# Altium footprint library PcbLib_ICs.PcbLib: 317 footprints (part 10 of 24) (continued)
## LQFN28 [mm] "QFN-28 package 4x5 mm from Linear Technology devices" (continued)
  lines w0.05: -2.6,-3.1 -2.6,3.1 2.6,3.1 2.6,-3.1 -2.6,-3.1
  lines w0.1: -0.5,0 0.5,0 ; 0,-0.5 0,0.5
3D body "QFN-28(LINEAR).step": height 0.75, standoff 0, extent -2.1,-2.6 2.1,2.6

## LQFP-32 [mm] "TQFP, 32-Leads, Body 7.00x7.00mm, Pitch 0.80mm, IPC Medium Density"
height 1.6
pads (32):
  rect 1.4x0.55 smd paste+0 mask+0.05: 1(-4.2,2.8)
  oval 1.4x0.55 smd paste+0 mask+0.05: 2(-4.2,2) 3(-4.2,1.2) 4(-4.2,0.4) 5(-4.2,-0.4) 6(-4.2,-1.2) 7(-4.2,-2) 8(-4.2,-2.8) 17(4.2,-2.8) 18(4.2,-2) 19(4.2,-1.2) 20(4.2,-0.4) 21(4.2,0.4) 22(4.2,1.2) 23(4.2,2) 24(4.2,2.8)
  oval 0.55x1.4 smd paste+0 mask+0.05: 9(-2.8,-4.2) 10(-2,-4.2) 11(-1.2,-4.2) 12(-0.4,-4.2) 13(0.4,-4.2) 14(1.2,-4.2) 15(2,-4.2) 16(2.8,-4.2) 25(2.8,4.2) 26(2,4.2) 27(1.2,4.2) 28(0.4,4.2) 29(-0.4,4.2) 30(-1.2,4.2) 31(-2,4.2) 32(-2.8,4.2)
Top Overlay:
  circle w0.25: c-2.5,2.5 r0.125
  circle w0.25: c-4.75,3.625 r0.125
  rectangle: -3.75,3.2 -3.2,3.75
  lines w0.2: -3.65,-3.3 -3.65,-3.65 -3.3,-3.65 ; 3.3,-3.65 3.65,-3.65 3.65,-3.3 ; 3.3,3.65 3.65,3.65 3.65,3.3
Top Assy:
  drawing of 571 lines, arcs and shapes, not listed
  text ".Designator" at -3.443,-0.467 h2
Top Text:
  lines w0.05: -5.15,-5.15 -5.15,5.15 5.15,5.15 5.15,-5.15 -5.15,-5.15
  lines w0.1: -0.5,0 0.5,0 ; 0,-0.5 0,0.5
3D body "lqfp32.STEP": height 1.5, standoff 0.02, extent -4.5,-4.5 4.5,4.5

## LQFP-48 [mm] "TSQFP, 48-Leads, Body 7,00x7,00mm, Pitch 0,50mm, IPC Medium Density"
height 1.6
pads (48):
  rect 1.45x0.3 smd paste+0 mask+0.05: 1(-4.225,2.75)
  oval 1.45x0.3 smd paste+0 mask+0.05: 2(-4.225,2.25) 3(-4.225,1.75) 4(-4.225,1.25) 5(-4.225,0.75) 6(-4.225,0.25) 7(-4.225,-0.25) 8(-4.225,-0.75) 9(-4.225,-1.25) 10(-4.225,-1.75) 11(-4.225,-2.25) 12(-4.225,-2.75) 25(4.225,-2.75) 26(4.225,-2.25) 27(4.225,-1.75) 28(4.225,-1.25) 29(4.225,-0.75) 30(4.225,-0.25) 31(4.225,0.25) 32(4.225,0.75) 33(4.225,1.25) 34(4.225,1.75) 35(4.225,2.25) 36(4.225,2.75)
  oval 0.3x1.45 smd paste+0 mask+0.05: 13(-2.75,-4.225) 14(-2.25,-4.225) 15(-1.75,-4.225) 16(-1.25,-4.225) 17(-0.75,-4.225) 18(-0.25,-4.225) 19(0.25,-4.225) 20(0.75,-4.225) 21(1.25,-4.225) 22(1.75,-4.225) 23(2.25,-4.225) 24(2.75,-4.225) 37(2.75,4.225) 38(2.25,4.225) 39(1.75,4.225) 40(1.25,4.225) 41(0.75,4.225) 42(0.25,4.225) 43(-0.25,4.225) 44(-0.75,4.225) 45(-1.25,4.225) 46(-1.75,4.225) 47(-2.25,4.225) 48(-2.75,4.225)
Top Overlay:
  circle w0.25: c-4.25,3.5 r0.125
  rectangle: -3.85,3.15 -3.15,3.85
  lines w0.2: -3.75,-3.225 -3.75,-3.75 -3.225,-3.75 ; 3.225,-3.75 3.75,-3.75 3.75,-3.225 ; 3.225,3.75 3.75,3.75 3.75,3.225
Top Assy:
  drawing of 713 lines, arcs and shapes, not listed
  text ".Designator" at -3.443,-0.467 h2
Top Text:
  lines w0.05: -5.2,-5.2 5.2,-5.2 5.2,5.2 -5.2,5.2 -5.2,-5.2
  lines w0.1: -0.5,0 0.5,0 ; 0,-0.5 0,0.5
3D body "User Library-LQFP48_Grid_0_5.STEP": height 1.6, standoff 0, extent -4.5,-4.499 4.5,4.501

## LQFP-48EP [mm] "TSQFP, 48-Leads, Body 7,00x7,00mm, Pitch 0,50mm, IPC Medium Density"
height 1.6
pads (49):
  rect 1.45x0.3 smd paste+0 mask+0.05: 1(-4.225,2.75)
  oval 1.45x0.3 smd paste+0 mask+0.05: 2(-4.225,2.25) 3(-4.225,1.75) 4(-4.225,1.25) 5(-4.225,0.75) 6(-4.225,0.25) 7(-4.225,-0.25) 8(-4.225,-0.75) 9(-4.225,-1.25) 10(-4.225,-1.75) 11(-4.225,-2.25) 12(-4.225,-2.75) 25(4.225,-2.75) 26(4.225,-2.25) 27(4.225,-1.75) 28(4.225,-1.25) 29(4.225,-0.75) 30(4.225,-0.25) 31(4.225,0.25) 32(4.225,0.75) 33(4.225,1.25) 34(4.225,1.75) 35(4.225,2.25) 36(4.225,2.75)
  oval 0.3x1.45 smd paste+0 mask+0.05: 13(-2.75,-4.225) 14(-2.25,-4.225) 15(-1.75,-4.225) 16(-1.25,-4.225) 17(-0.75,-4.225) 18(-0.25,-4.225) 19(0.25,-4.225) 20(0.75,-4.225) 21(1.25,-4.225) 22(1.75,-4.225) 23(2.25,-4.225) 24(2.75,-4.225) 37(2.75,4.225) 38(2.25,4.225) 39(1.75,4.225) 40(1.25,4.225) 41(0.75,4.225) 42(0.25,4.225) 43(-0.25,4.225) 44(-0.75,4.225) 45(-1.25,4.225) 46(-1.75,4.225) 47(-2.25,4.225) 48(-2.75,4.225)
  rrect15% 4x4 smd paste-50 mask+0.05: EP(0,0)
via 0,0 diameter 0.7 hole 0.3
via -0.6,0.6 diameter 0.7 hole 0.3
via 0.6,0.6 diameter 0.7 hole 0.3
via 0.8,1.4 diameter 0.7 hole 0.3
via 1.4,0.8 diameter 0.7 hole 0.3
via -0.7,1.4 diameter 0.7 hole 0.3
via -1.4,0.9 diameter 0.7 hole 0.3
via 1.4,-0.9 diameter 0.7 hole 0.3
via 0.7,-1.4 diameter 0.7 hole 0.3
via -1.4,-0.8 diameter 0.7 hole 0.3
via -0.8,-1.4 diameter 0.7 hole 0.3
via -0.6,-0.6 diameter 0.7 hole 0.3
via 0.6,-0.6 diameter 0.7 hole 0.3
Top Overlay:
  circle w0.25: c-4.25,3.5 r0.125
  rectangle: -3.85,3.15 -3.15,3.85
  lines w0.2: -3.75,-3.225 -3.75,-3.75 -3.225,-3.75 ; 3.225,-3.75 3.75,-3.75 3.75,-3.225 ; 3.225,3.75 3.75,3.75 3.75,3.225
Top Paste:
  region: 0.3,1.1 -0.3,1.1 -0.3,0.5 0.3,0.5
  region: 1.1,1.1 0.5,1.1 0.5,0.5 1.1,0.5
  rectangle: -1.1,0.5 -0.5,1.1
  region: 0.3,0.3 -0.3,0.3 -0.3,-0.3 0.3,-0.3
  region: 1.1,0.3 0.5,0.3 0.5,-0.3 1.1,-0.3
  rectangle: -1.1,-0.3 -0.5,0.3
  region: 0.3,-0.5 -0.3,-0.5 -0.3,-1.1 0.3,-1.1
  region: 1.1,-0.5 0.5,-0.5 0.5,-1.1 1.1,-1.1
  rectangle: -1.1,-1.1 -0.5,-0.5
  rectangle: -1.9,0.5 -1.3,1.1
  rectangle: -1.9,-0.3 -1.3,0.3
  rectangle: -1.9,-1.1 -1.3,-0.5
  region: 1.9,-0.5 1.3,-0.5 1.3,-1.1 1.9,-1.1
  region: 1.9,0.3 1.3,0.3 1.3,-0.3 1.9,-0.3
  region: 1.9,1.1 1.3,1.1 1.3,0.5 1.9,0.5
  region: 0.3,1.9 -0.3,1.9 -0.3,1.3 0.3,1.3
  region: 1.1,1.9 0.5,1.9 0.5,1.3 1.1,1.3
  rectangle: -1.1,1.3 -0.5,1.9
  rectangle: -1.9,1.3 -1.3,1.9
  region: 1.9,1.9 1.3,1.9 1.3,1.3 1.9,1.3
  rectangle: -0.3,-1.9 0.3,-1.3
  rectangle: -1.1,-1.9 -0.5,-1.3
  region: 1.1,-1.3 0.5,-1.3 0.5,-1.9 1.1,-1.9
  region: 1.9,-1.3 1.3,-1.3 1.3,-1.9 1.9,-1.9
  rectangle: -1.9,-1.9 -1.3,-1.3
Bottom Solder:
  region: -2.25,2.25 -0.475,2.25 0,1.774 0.476,2.25 2.25,2.25 2.25,0.476 1.773,0 2.25,-0.477 2.25,-2.25 0.477,-2.249 0,-1.772 -0.477,-2.25 -2.25,-2.249 -2.25,-0.475 -1.775,0 -2.25,0.475
Top Assy:
  drawing of 713 lines, arcs and shapes, not listed
  text ".Designator" at -3.443,-0.467 h2
Top Text:
  lines w0.05: -5.2,-5.2 5.2,-5.2 5.2,5.2 -5.2,5.2 -5.2,-5.2
  lines w0.1: -0.5,0 0.5,0 ; 0,-0.5 0,0.5
3D body "User Library-LQFP-48 LXE.step": height 1.6, standoff 0, extent -4.513,-4.513 4.513,4.513

## LQFP-64 [mm] "LQFP-64 package with 0.5mm pitch"
height 1.6
pads (64):
  rect 1.45x0.3 smd paste+0 mask+0.05: 1(-5.725,3.75)
  oval 1.45x0.3 smd paste+0 mask+0.05: 2(-5.725,3.25) 3(-5.725,2.75) 4(-5.725,2.25) 5(-5.725,1.75) 6(-5.725,1.25) 7(-5.725,0.75) 8(-5.725,0.25) 9(-5.725,-0.25) 10(-5.725,-0.75) 11(-5.725,-1.25) 12(-5.725,-1.75) 13(-5.725,-2.25) 14(-5.725,-2.75) 15(-5.725,-3.25) 16(-5.725,-3.75) 33(5.725,-3.75) 34(5.725,-3.25) 35(5.725,-2.75) 36(5.725,-2.25) 37(5.725,-1.75) 38(5.725,-1.25) 39(5.725,-0.75) 40(5.725,-0.25) 41(5.725,0.25) 42(5.725,0.75) 43(5.725,1.25) 44(5.725,1.75) 45(5.725,2.25) 46(5.725,2.75) 47(5.725,3.25) 48(5.725,3.75)
  oval 0.3x1.45 smd paste+0 mask+0.05: 17(-3.75,-5.725) 18(-3.25,-5.725) 19(-2.75,-5.725) 20(-2.25,-5.725) 21(-1.75,-5.725) 22(-1.25,-5.725) 23(-0.75,-5.725) 24(-0.25,-5.725) 25(0.25,-5.725) 26(0.75,-5.725) 27(1.25,-5.725) 28(1.75,-5.725) 29(2.25,-5.725) 30(2.75,-5.725) 31(3.25,-5.725) 32(3.75,-5.725) 49(3.75,5.725) 50(3.25,5.725) 51(2.75,5.725) 52(2.25,5.725) 53(1.75,5.725) 54(1.25,5.725) 55(0.75,5.725) 56(0.25,5.725) 57(-0.25,5.725) 58(-0.75,5.725) 59(-1.25,5.725) 60(-1.75,5.725) 61(-2.25,5.725) 62(-2.75,5.725) 63(-3.25,5.725) 64(-3.75,5.725)
Top Overlay:
  circle w0.25: c-6.125,4.5 r0.125
  rectangle: -5.35,4.15 -4.15,5.35
  lines w0.2: -7.75,-3.75 -6.75,-3.75 ; -7.75,0.25 -6.75,0.25 ; -7.75,3.75 -6.75,3.75 ; -5.25,-4.25 -5.25,-5.25 -4.25,-5.25 ; -3.75,-7.75 -3.75,-6.75 ; -3.75,6.75 -3.75,7.75 ; -0.25,-7.75 -0.25,-6.75 ; 0.25,6.75 0.25,7.75 ; 3.75,-7.75 3.75,-6.75 ; 3.75,6.75 3.75,7.75 ; 4.25,-5.25 5.25,-5.25 5.25,-4.25 ; 4.25,5.25 5.25,5.25 5.25,4.25 ; 6.75,-3.75 7.75,-3.75 ; 6.75,-0.25 7.75,-0.25 ; 6.75,3.75 7.75,3.75
Top Assy:
  drawing of 2585 lines, arcs and shapes, not listed
  text ".Designator" at -3.443,-0.467 h2
Top Text:
  lines w0.05: -6.7,-6.7 -6.7,6.7 6.7,6.7 6.7,-6.7 -6.7,-6.7
  lines w0.1: -0.5,0 0.5,0 ; 0,-0.5 0,0.5
3D body "User Library-LQFP64-1_0.5mm_pitch.step": height 1.56, standoff 0, extent -6,-6 6,6

## LQFP-80 [mm] "LQFP, 80-Leads, Body 12,00x12,00mm, Pitch 0,50mm, IPC Medium Density"
height 1.6
pads (80):
  rect 1.45x0.3 smd mask+0.05: 1(-6.725,4.75)
  oval 1.45x0.3 smd mask+0.05: 2(-6.725,4.25) 3(-6.725,3.75) 4(-6.725,3.25) 5(-6.725,2.75) 6(-6.725,2.25) 7(-6.725,1.75) 8(-6.725,1.25) 9(-6.725,0.75) 10(-6.725,0.25) 11(-6.725,-0.25) 12(-6.725,-0.75) 13(-6.725,-1.25) 14(-6.725,-1.75) 15(-6.725,-2.25) 16(-6.725,-2.75) 17(-6.725,-3.25) 18(-6.725,-3.75) 19(-6.725,-4.25) 20(-6.725,-4.75) 41(6.725,-4.75) 42(6.725,-4.25) 43(6.725,-3.75) 44(6.725,-3.25) 45(6.725,-2.75) 46(6.725,-2.25) 47(6.725,-1.75) 48(6.725,-1.25) 49(6.725,-0.75) 50(6.725,-0.25) 51(6.725,0.25) 52(6.725,0.75) 53(6.725,1.25) 54(6.725,1.75) 55(6.725,2.25) 56(6.725,2.75) 57(6.725,3.25) 58(6.725,3.75) 59(6.725,4.25) 60(6.725,4.75)
  oval 0.3x1.45 smd mask+0.05: 21(-4.75,-6.725) 22(-4.25,-6.725) 23(-3.75,-6.725) 24(-3.25,-6.725) 25(-2.75,-6.725) 26(-2.25,-6.725) 27(-1.75,-6.725) 28(-1.25,-6.725) 29(-0.75,-6.725) 30(-0.25,-6.725) 31(0.25,-6.725) 32(0.75,-6.725) 33(1.25,-6.725) 34(1.75,-6.725) 35(2.25,-6.725) 36(2.75,-6.725) 37(3.25,-6.725) 38(3.75,-6.725) 39(4.25,-6.725) 40(4.75,-6.725) 61(4.75,6.725) 62(4.25,6.725) 63(3.75,6.725) 64(3.25,6.725) 65(2.75,6.725) 66(2.25,6.725) 67(1.75,6.725) 68(1.25,6.725) 69(0.75,6.725) 70(0.25,6.725) 71(-0.25,6.725) 72(-0.75,6.725) 73(-1.25,6.725) 74(-1.75,6.725) 75(-2.25,6.725) 76(-2.75,6.725) 77(-3.25,6.725) 78(-3.75,6.725) 79(-4.25,6.725) 80(-4.75,6.725)
Top Overlay:
  circle w0.25: c-7,5.5 r0.125
  rectangle: -6.35,5.15 -5.15,6.35
  lines w0.2: -8.75,-4.75 -7.75,-4.75 ; -8.75,0.25 -7.75,0.25 ; -8.75,4.75 -7.75,4.75 ; -6.25,-5.25 -6.25,-6.25 -5.25,-6.25 ; -4.75,-8.75 -4.75,-7.75 ; -4.75,7.75 -4.75,8.75 ; -0.25,-8.75 -0.25,-7.75 ; 0.25,7.75 0.25,8.75 ; 4.75,-8.75 4.75,-7.75 ; 4.75,7.75 4.75,8.75 ; 5.25,-6.25 6.25,-6.25 6.25,-5.25 ; 5.25,6.25 6.25,6.25 6.25,5.25 ; 7.75,-4.75 8.75,-4.75 ; 7.75,-0.25 8.75,-0.25 ; 7.75,4.75 8.75,4.75
Top Assy:
  drawing of 1145 lines, arcs and shapes, not listed
Top Text:
  lines w0.05: -7.7,-7.7 7.7,-7.7 7.7,7.7 -7.7,7.7 -7.7,-7.7
  lines w0.1: -0.5,0 0.5,0 ; 0,-0.5 0,0.5
3D body "S-PQFP-G80.step": height 1.6, standoff 0, extent -7.1,-7.1 7.1,7.1

## LQFP-100 [mm] "TSQFP, 100-Leads, Body 14,00x14,00mm, Pitch 0,50mm, IPC Medium Density"
height 1.6
pads (100):
  rect 1.45x0.3 smd paste+0 mask+0.05: 1(-7.725,6)
  oval 1.45x0.3 smd paste+0 mask+0.05: 2(-7.725,5.5) 3(-7.725,5) 4(-7.725,4.5) 5(-7.725,4) 6(-7.725,3.5) 7(-7.725,3) 8(-7.725,2.5) 9(-7.725,2) 10(-7.725,1.5) 11(-7.725,1) 12(-7.725,0.5) 13(-7.725,0) 14(-7.725,-0.5) 15(-7.725,-1) 16(-7.725,-1.5) 17(-7.725,-2) 18(-7.725,-2.5) 19(-7.725,-3) 20(-7.725,-3.5) 21(-7.725,-4) 22(-7.725,-4.5) 23(-7.725,-5) 24(-7.725,-5.5) 25(-7.725,-6) 51(7.725,-6) 52(7.725,-5.5) 53(7.725,-5) 54(7.725,-4.5) 55(7.725,-4) 56(7.725,-3.5) 57(7.725,-3) 58(7.725,-2.5) 59(7.725,-2) 60(7.725,-1.5) 61(7.725,-1) 62(7.725,-0.5) 63(7.725,0) 64(7.725,0.5) 65(7.725,1) 66(7.725,1.5) 67(7.725,2) 68(7.725,2.5) 69(7.725,3) 70(7.725,3.5) 71(7.725,4) 72(7.725,4.5) 73(7.725,5) 74(7.725,5.5) 75(7.725,6)
  oval 0.3x1.45 smd paste+0 mask+0.05: 26(-6,-7.725) 27(-5.5,-7.725) 28(-5,-7.725) 29(-4.5,-7.725) 30(-4,-7.725) 31(-3.5,-7.725) 32(-3,-7.725) 33(-2.5,-7.725) 34(-2,-7.725) 35(-1.5,-7.725) 36(-1,-7.725) 37(-0.5,-7.725) 38(0,-7.725) 39(0.5,-7.725) 40(1,-7.725) 41(1.5,-7.725) 42(2,-7.725) 43(2.5,-7.725) 44(3,-7.725) 45(3.5,-7.725) 46(4,-7.725) 47(4.5,-7.725) 48(5,-7.725) 49(5.5,-7.725) 50(6,-7.725) 76(6,7.725) 77(5.5,7.725) 78(5,7.725) 79(4.5,7.725) 80(4,7.725) 81(3.5,7.725) 82(3,7.725) 83(2.5,7.725) 84(2,7.725) 85(1.5,7.725) 86(1,7.725) 87(0.5,7.725) 88(0,7.725) 89(-0.5,7.725) 90(-1,7.725) 91(-1.5,7.725) 92(-2,7.725) 93(-2.5,7.725) 94(-3,7.725) 95(-3.5,7.725) 96(-4,7.725) 97(-4.5,7.725) 98(-5,7.725) 99(-5.5,7.725) 100(-6,7.725)
Top Overlay:
  circle w0.6: c-5.225,5.25 r0.3
  circle w0.25: c-8.125,6.75 r0.125
  rectangle: -7.25,6.45 -6.45,7.25
  lines w0.2: -9.75,-6 -8.75,-6 ; -9.75,-3.5 -8.75,-3.5 ; -9.75,-1 -8.75,-1 ; -9.75,1.5 -8.75,1.5 ; -9.75,4 -8.75,4 ; -9.75,6 -8.75,6 ; -7.15,-6.55 -7.15,-7.15 -6.525,-7.15 ; -6,-9.75 -6,-8.75 ; -6,8.75 -6,9.75 ; -4,-9.75 -4,-8.75 ; -3.5,8.75 -3.5,9.75 ; -1.5,-9.75 -1.5,-8.75 ; -1,8.75 -1,9.75 ; 1,-9.75 1,-8.75 ; 1.5,8.75 1.5,9.75 ; 3.5,-9.75 3.5,-8.75 ; 3.5,8.75 3.5,9.75 ; 6,-9.75 6,-8.75 ; 6,8.75 6,9.75 ; 6.525,7.15 7.15,7.15 7.15,6.55 ; 6.55,-7.15 7.15,-7.15 7.15,-6.525 ; 8.75,-6 9.75,-6 ; 8.75,-4 9.75,-4 ; 8.75,-1.5 9.75,-1.5 ; 8.75,1 9.75,1 ; 8.75,3.5 9.75,3.5 ; 8.75,6 9.75,6
Bottom Simple Assy:
  region: 5.888,8 5.888,7 6.108,7 6.108,8
  region: 5.388,8 5.388,7 5.608,7 5.608,8
  region: 4.888,8 4.888,7 5.108,7 5.108,8
  region: 4.388,8 4.388,7 4.608,7 4.608,8
  region: 2.388,8 2.388,7 2.608,7 2.608,8
  region: 2.888,8 2.888,7 3.108,7 3.108,8
  region: 3.388,8 3.388,7 3.608,7 3.608,8
  region: 3.888,8 3.888,7 4.108,7 4.108,8
  region: -0.112,8 -0.112,7 0.108,7 0.108,8
  region: -0.612,8 -0.612,7 -0.392,7 -0.392,8
  region: -1.112,8 -1.112,7 -0.892,7 -0.892,8
  region: -1.612,8 -1.612,7 -1.392,7 -1.392,8
  region: 0.388,8 0.388,7 0.608,7 0.608,8
  region: 0.888,8 0.888,7 1.108,7 1.108,8
  region: 1.388,8 1.388,7 1.608,7 1.608,8
  region: 1.888,8 1.888,7 2.108,7 2.108,8
  region: -4.112,8 -4.112,7 -3.892,7 -3.892,8
  region: -4.612,8 -4.612,7 -4.392,7 -4.392,8
  region: -5.113,8 -5.113,7 -4.893,7 -4.893,8
  region: -5.612,8 -5.612,7 -5.393,7 -5.393,8
  region: -3.612,8 -3.612,7 -3.392,7 -3.392,8
  region: -3.112,8 -3.112,7 -2.892,7 -2.892,8
  region: -2.612,8 -2.612,7 -2.392,7 -2.392,8
  region: -2.112,8 -2.112,7 -1.892,7 -1.892,8
  region: -6.112,8 -6.112,7 -5.892,7 -5.892,8
  region: 7.998,-5.89 6.998,-5.89 6.998,-6.11 7.998,-6.11
  region: 7.998,-5.39 6.998,-5.39 6.998,-5.61 7.998,-5.61
  region: 7.998,-4.89 6.998,-4.89 6.998,-5.11 7.998,-5.11
  region: 7.998,-4.39 6.998,-4.39 6.998,-4.61 7.998,-4.61
  region: 7.998,-2.39 6.998,-2.39 6.998,-2.61 7.998,-2.61
  region: 7.998,-2.89 6.998,-2.89 6.998,-3.11 7.998,-3.11
  region: 7.998,-3.39 6.998,-3.39 6.998,-3.61 7.998,-3.61
  region: 7.998,-3.89 6.998,-3.89 6.998,-4.11 7.998,-4.11
  region: 7.998,0.11 6.998,0.11 6.998,-0.11 7.998,-0.11
  region: 7.998,0.61 6.998,0.61 6.998,0.39 7.998,0.39
  region: 7.998,1.11 6.998,1.11 6.998,0.89 7.998,0.89
  region: 7.998,1.61 6.998,1.61 6.998,1.39 7.998,1.39
  region: 7.998,-0.39 6.998,-0.39 6.998,-0.61 7.998,-0.61
  region: 7.998,-0.89 6.998,-0.89 6.998,-1.11 7.998,-1.11
  region: 7.998,-1.39 6.998,-1.39 6.998,-1.61 7.998,-1.61
  region: 7.998,-1.89 6.998,-1.89 6.998,-2.11 7.998,-2.11
  region: 7.998,4.11 6.998,4.11 6.998,3.89 7.998,3.89
  region: 7.998,4.61 6.998,4.61 6.998,4.39 7.998,4.39
  region: 7.998,5.11 6.998,5.11 6.998,4.89 7.998,4.89
  region: 7.998,5.61 6.998,5.61 6.998,5.39 7.998,5.39
  region: 7.998,3.61 6.998,3.61 6.998,3.39 7.998,3.39
  region: 7.998,3.11 6.998,3.11 6.998,2.89 7.998,2.89
  region: 7.998,2.61 6.998,2.61 6.998,2.39 7.998,2.39
  region: 7.998,2.11 6.998,2.11 6.998,1.89 7.998,1.89
  region: 7.998,6.11 6.998,6.11 6.998,5.89 7.998,5.89
  region: -5.892,-8 -5.892,-7 -6.112,-7 -6.112,-8
  region: -5.392,-8 -5.392,-7 -5.612,-7 -5.612,-8
  region: -4.892,-8 -4.892,-7 -5.112,-7 -5.112,-8
  region: -4.392,-8 -4.392,-7 -4.612,-7 -4.612,-8
  region: -2.392,-8 -2.392,-7 -2.612,-7 -2.612,-8
  region: -2.892,-8 -2.892,-7 -3.112,-7 -3.112,-8
  region: -3.392,-8 -3.392,-7 -3.612,-7 -3.612,-8
  region: -3.892,-8 -3.892,-7 -4.112,-7 -4.112,-8
  region: 0.108,-8 0.108,-7 -0.112,-7 -0.112,-8
  region: 0.608,-8 0.608,-7 0.388,-7 0.388,-8
  region: 1.108,-8 1.108,-7 0.888,-7 0.888,-8
  region: 1.608,-8 1.608,-7 1.388,-7 1.388,-8
  region: -0.392,-8 -0.392,-7 -0.612,-7 -0.612,-8
  region: -0.892,-8 -0.892,-7 -1.112,-7 -1.112,-8
  region: -1.392,-8 -1.392,-7 -1.612,-7 -1.612,-8
  region: -1.892,-8 -1.892,-7 -2.112,-7 -2.112,-8
  region: 4.108,-8 4.108,-7 3.888,-7 3.888,-8
  region: 4.608,-8 4.608,-7 4.388,-7 4.388,-8
  region: 5.108,-8 5.108,-7 4.888,-7 4.888,-8
  region: 5.608,-8 5.608,-7 5.388,-7 5.388,-8
  region: 3.608,-8 3.608,-7 3.388,-7 3.388,-8
  region: 3.108,-8 3.108,-7 2.888,-7 2.888,-8
  region: 2.608,-8 2.608,-7 2.388,-7 2.388,-8
  region: 2.108,-8 2.108,-7 1.888,-7 1.888,-8
  region: 6.108,-8 6.108,-7 5.888,-7 5.888,-8
  rectangle: -8.003,-6.11 -7.003,-5.89
  rectangle: -8.003,-2.11 -7.003,-1.89
  rectangle: -8.003,-2.61 -7.003,-2.39
  rectangle: -8.003,-3.11 -7.003,-2.89
  rectangle: -8.003,-3.61 -7.003,-3.39
  rectangle: -8.003,-5.61 -7.003,-5.39
  rectangle: -8.003,-5.11 -7.003,-4.89
  rectangle: -8.003,-4.61 -7.003,-4.39
  rectangle: -8.003,-4.11 -7.003,-3.89
  rectangle: -8.003,1.89 -7.003,2.11
  rectangle: -8.003,1.39 -7.003,1.61
  rectangle: -8.003,0.89 -7.003,1.11
  rectangle: -8.003,0.39 -7.003,0.61
  rectangle: -8.003,-1.61 -7.003,-1.39
  rectangle: -8.003,-1.11 -7.003,-0.89
  rectangle: -8.003,-0.61 -7.003,-0.39
  rectangle: -8.003,-0.11 -7.003,0.11
  rectangle: -8.003,3.89 -7.003,4.11
  rectangle: -8.003,3.39 -7.003,3.61
  rectangle: -8.003,2.89 -7.003,3.11
  rectangle: -8.003,2.39 -7.003,2.61
  rectangle: -8.003,4.39 -7.003,4.61
  rectangle: -8.003,4.89 -7.003,5.11
  rectangle: -8.003,5.39 -7.003,5.61
  rectangle: -8.003,5.89 -7.003,6.11
Top Assy:
  drawing of 1489 lines, arcs and shapes, not listed
  text ".Designator" at -3.443,-0.467 h2
Top Text:
  lines w0.05: -8.7,-8.7 8.7,-8.7 8.7,8.7 -8.7,8.7 -8.7,-8.7
  lines w0.1: -0.5,0 0.5,0 ; 0,-0.5 0,0.5
3D body "LQFP100.STEP": height 1.6, standoff 0, extent -8,-8 8,8

## LQFP-128 [mm] "TSQFP, 128-Leads, Body 14.00x14.00mm, Pitch 0.40mm, IPC Medium Density"
height 1.6
pads (128):
  rect 1.3x0.2 smd paste+0 mask+0.05: 1(-7.725,6.2)
  oval 1.3x0.2 smd paste+0 mask+0.05: 2(-7.725,5.8) 3(-7.725,5.4) 4(-7.725,5) 5(-7.725,4.6) 6(-7.725,4.2) 7(-7.725,3.8) 8(-7.725,3.4) 9(-7.725,3) 10(-7.725,2.6) 11(-7.725,2.2) 12(-7.725,1.8) 13(-7.725,1.4) 14(-7.725,1) 15(-7.725,0.6) 16(-7.725,0.2) 17(-7.725,-0.2) 18(-7.725,-0.6) 19(-7.725,-1) 20(-7.725,-1.4) 21(-7.725,-1.8) 22(-7.725,-2.2) 23(-7.725,-2.6) 24(-7.725,-3) 25(-7.725,-3.4) 26(-7.725,-3.8) 27(-7.725,-4.2) 28(-7.725,-4.6) 29(-7.725,-5) 30(-7.725,-5.4) 31(-7.725,-5.8) 32(-7.725,-6.2) 65(7.725,-6.2) 66(7.725,-5.8) 67(7.725,-5.4) 68(7.725,-5) 69(7.725,-4.6) 70(7.725,-4.2) 71(7.725,-3.8) 72(7.725,-3.4) 73(7.725,-3) 74(7.725,-2.6) 75(7.725,-2.2) 76(7.725,-1.8) 77(7.725,-1.4) 78(7.725,-1) 79(7.725,-0.6) 80(7.725,-0.2) 81(7.725,0.2) 82(7.725,0.6) 83(7.725,1) 84(7.725,1.4) 85(7.725,1.8) 86(7.725,2.2) 87(7.725,2.6) 88(7.725,3) 89(7.725,3.4) 90(7.725,3.8) 91(7.725,4.2) 92(7.725,4.6) 93(7.725,5) 94(7.725,5.4) 95(7.725,5.8) 96(7.725,6.2)
  oval 0.2x1.3 smd paste+0 mask+0.05: 33(-6.2,-7.725) 34(-5.8,-7.725) 35(-5.4,-7.725) 36(-5,-7.725) 37(-4.6,-7.725) 38(-4.2,-7.725) 39(-3.8,-7.725) 40(-3.4,-7.725) 41(-3,-7.725) 42(-2.6,-7.725) 43(-2.2,-7.725) 44(-1.8,-7.725) 45(-1.4,-7.725) 46(-1,-7.725) 47(-0.6,-7.725) 48(-0.2,-7.725) 49(0.2,-7.725) 50(0.6,-7.725) 51(1,-7.725) 52(1.4,-7.725) 53(1.8,-7.725) 54(2.2,-7.725) 55(2.6,-7.725) 56(3,-7.725) 57(3.4,-7.725) 58(3.8,-7.725) 59(4.2,-7.725) 60(4.6,-7.725) 61(5,-7.725) 62(5.4,-7.725) 63(5.8,-7.725) 64(6.2,-7.725) 97(6.2,7.725) 98(5.8,7.725) 99(5.4,7.725) 100(5,7.725) 101(4.6,7.725) 102(4.2,7.725) 103(3.8,7.725) 104(3.4,7.725) 105(3,7.725) 106(2.6,7.725) 107(2.2,7.725) 108(1.8,7.725) 109(1.4,7.725) 110(1,7.725) 111(0.6,7.725) 112(0.2,7.725) 113(-0.2,7.725) 114(-0.6,7.725) 115(-1,7.725) 116(-1.4,7.725) 117(-1.8,7.725) 118(-2.2,7.725) 119(-2.6,7.725) 120(-3,7.725) 121(-3.4,7.725) 122(-3.8,7.725) 123(-4.2,7.725) 124(-4.6,7.725) 125(-5,7.725) 126(-5.4,7.725) 127(-5.8,7.725) 128(-6.2,7.725)
Top Overlay:
  circle w0.25: c-7.725,6.9 r0.125
  circle w0.6: c-5.6,5.6 r0.3
  rectangle: -7.175,6.5 -6.5,7.175
  lines w0.2: -9.6,-6.2 -8.6,-6.2 ; -9.6,-3 -8.6,-3 ; -9.6,0.2 -8.6,0.2 ; -9.6,3.4 -8.6,3.4 ; -9.6,6.2 -8.6,6.2 ; -7.125,-6.65 -7.125,-7.125 -6.65,-7.125 ; -7.075,6.6 -7.075,7.075 -6.6,7.075 ; -6.2,-9.6 -6.2,-8.6 ; -6.2,8.6 -6.2,9.6 ; -3.4,-9.6 -3.4,-8.6 ; -3,8.6 -3,9.6 ; -0.2,-9.6 -0.2,-8.6 ; 0.2,8.6 0.2,9.6 ; 3,-9.6 3,-8.6 ; 3.4,8.6 3.4,9.6 ; 6.2,-9.6 6.2,-8.6 ; 6.2,8.6 6.2,9.6 ; 6.65,-7.125 7.125,-7.125 7.125,-6.65 ; 6.65,7.125 7.125,7.125 7.125,6.65 ; 8.6,-6.2 9.6,-6.2 ; 8.6,-3.4 9.6,-3.4 ; 8.6,-0.2 9.6,-0.2 ; 8.6,3 9.6,3 ; 8.6,6.2 9.6,6.2
Top Assy:
  drawing of 1542 lines, arcs and shapes, not listed
  text ".Designator" at -3.443,-0.467 h2
Top Text:
  lines w0.05: -8.7,-8.7 -8.7,8.7 8.7,8.7 8.7,-8.7 -8.7,-8.7
  lines w0.1: -0.5,0 0.5,0 ; 0,-0.5 0,0.5
3D body "User Library-LQFP-128 (1).step": height 1.35, standoff 0, extent -8,-8 8,8

## LQFP-144 [mm] "TSQFP, 144-Leads, Body 20,00x20,00mm, Pitch 0,50mm, IPC Medium Density"
height 1.6
pads (144):
  rect 1.45x0.3 smd paste+0 mask+0.08: 1(-10.725,8.75)
  oval 1.45x0.3 smd paste+0 mask+0.08: 2(-10.725,8.25) 3(-10.725,7.75) 4(-10.725,7.25) 5(-10.725,6.75) 6(-10.725,6.25) 7(-10.725,5.75) 8(-10.725,5.25) 9(-10.725,4.75) 10(-10.725,4.25) 11(-10.725,3.75) 12(-10.725,3.25) 13(-10.725,2.75) 14(-10.725,2.25) 15(-10.725,1.75) 16(-10.725,1.25) 17(-10.725,0.75) 18(-10.725,0.25) 19(-10.725,-0.25) 20(-10.725,-0.75) 21(-10.725,-1.25) 22(-10.725,-1.75) 23(-10.725,-2.25) 24(-10.725,-2.75) 25(-10.725,-3.25) 26(-10.725,-3.75) 27(-10.725,-4.25) 28(-10.725,-4.75) 29(-10.725,-5.25) 30(-10.725,-5.75) 31(-10.725,-6.25) 32(-10.725,-6.75) 33(-10.725,-7.25) 34(-10.725,-7.75) 35(-10.725,-8.25) 36(-10.725,-8.75) 73(10.725,-8.75) 74(10.725,-8.25) 75(10.725,-7.75) 76(10.725,-7.25) 77(10.725,-6.75) 78(10.725,-6.25) 79(10.725,-5.75) 80(10.725,-5.25) 81(10.725,-4.75) 82(10.725,-4.25) 83(10.725,-3.75) 84(10.725,-3.25) 85(10.725,-2.75) 86(10.725,-2.25) 87(10.725,-1.75) 88(10.725,-1.25) 89(10.725,-0.75) 90(10.725,-0.25) 91(10.725,0.25) 92(10.725,0.75) 93(10.725,1.25) 94(10.725,1.75) 95(10.725,2.25) 96(10.725,2.75) 97(10.725,3.25) 98(10.725,3.75) 99(10.725,4.25) 100(10.725,4.75) 101(10.725,5.25) 102(10.725,5.75) 103(10.725,6.25) 104(10.725,6.75) 105(10.725,7.25) 106(10.725,7.75) 107(10.725,8.25) 108(10.725,8.75)
  oval 0.3x1.45 smd paste+0 mask+0.08: 37(-8.75,-10.725) 38(-8.25,-10.725) 39(-7.75,-10.725) 40(-7.25,-10.725) 41(-6.75,-10.725) 42(-6.25,-10.725) 43(-5.75,-10.725) 44(-5.25,-10.725) 45(-4.75,-10.725) 46(-4.25,-10.725) 47(-3.75,-10.725) 48(-3.25,-10.725) 49(-2.75,-10.725) 50(-2.25,-10.725) 51(-1.75,-10.725) 52(-1.25,-10.725) 53(-0.75,-10.725) 54(-0.25,-10.725) 55(0.25,-10.725) 56(0.75,-10.725) 57(1.25,-10.725) 58(1.75,-10.725) 59(2.25,-10.725) 60(2.75,-10.725) 61(3.25,-10.725) 62(3.75,-10.725) 63(4.25,-10.725) 64(4.75,-10.725) 65(5.25,-10.725) 66(5.75,-10.725) 67(6.25,-10.725) 68(6.75,-10.725) 69(7.25,-10.725) 70(7.75,-10.725) 71(8.25,-10.725) 72(8.75,-10.725) 109(8.75,10.725) 110(8.25,10.725) 111(7.75,10.725) 112(7.25,10.725) 113(6.75,10.725) 114(6.25,10.725) 115(5.75,10.725) 116(5.25,10.725) 117(4.75,10.725) 118(4.25,10.725) 119(3.75,10.725) 120(3.25,10.725) 121(2.75,10.725) 122(2.25,10.725) 123(1.75,10.725) 124(1.25,10.725) 125(0.75,10.725) 126(0.25,10.725) 127(-0.25,10.725) 128(-0.75,10.725) 129(-1.25,10.725) 130(-1.75,10.725) 131(-2.25,10.725) 132(-2.75,10.725) 133(-3.25,10.725) 134(-3.75,10.725) 135(-4.25,10.725) 136(-4.75,10.725) 137(-5.25,10.725) 138(-5.75,10.725) 139(-6.25,10.725) 140(-6.75,10.725) 141(-7.25,10.725) 142(-7.75,10.725) 143(-8.25,10.725) 144(-8.75,10.725)
Top Overlay:
  circle w0.25: c-11.25,9.5 r0.125
  circle w0.6: c-8.6,8.6 r0.3
  rectangle: -10.25,9.45 -9.45,10.25
  lines w0.2: -12.75,-8.75 -11.75,-8.75 ; -12.75,-5.75 -11.75,-5.75 ; -12.75,-2.75 -11.75,-2.75 ; -12.75,0.25 -11.75,0.25 ; -12.75,3.25 -11.75,3.25 ; -12.75,6.25 -11.75,6.25 ; -12.75,8.75 -11.75,8.75 ; -10.15,-9.55 -10.15,-10.15 -9.525,-10.15 ; -8.75,-12.75 -8.75,-11.75 ; -8.75,11.75 -8.75,12.75 ; -6.25,-12.75 -6.25,-11.75 ; -5.75,11.75 -5.75,12.75 ; -3.25,-12.75 -3.25,-11.75 ; -2.75,11.75 -2.75,12.75 ; -0.25,-12.75 -0.25,-11.75 ; 0.25,11.75 0.25,12.75 ; 2.75,-12.75 2.75,-11.75 ; 3.25,11.75 3.25,12.75 ; 5.75,-12.75 5.75,-11.75 ; 6.25,11.75 6.25,12.75 ; 8.75,-12.75 8.75,-11.75 ; 8.75,11.75 8.75,12.75 ; 9.525,10.15 10.15,10.15 10.15,9.55 ; 9.55,-10.15 10.15,-10.15 10.15,-9.525 ; 11.75,-8.75 12.75,-8.75 ; 11.75,-6.25 12.75,-6.25 ; 11.75,-3.25 12.75,-3.25 ; 11.75,-0.25 12.75,-0.25 ; 11.75,2.75 12.75,2.75 ; 11.75,5.75 12.75,5.75 ; 11.75,8.75 12.75,8.75
Top Assy:
  drawing of 2361 lines, arcs and shapes, not listed
  text ".Designator" at -3.443,-0.467 h2
Top Text:
  lines w0.05: -11.7,-11.7 -11.7,11.7 11.7,11.7 11.7,-11.7 -11.7,-11.7
  lines w0.1: -0.5,0 0.5,0 ; 0,-0.5 0,0.5
3D body "LQFP144-0_5.STEP": height 1.58, standoff 0.01, extent -10.875,-10.872 10.897,10.9